# Altium footprint library myLibraryAltium.PcbLib: 215 footprints (part 4 of 14)
Each footprint in its own frame and in the unit in brackets; x right, y up, seen from the top. Pads: shape width x height; smd on the part's side, far side on the other; paste and mask are expansions set on the pad; w line width, h text height; cw(c..) or ccw(c..) is an arc to the next point about the centre after c.
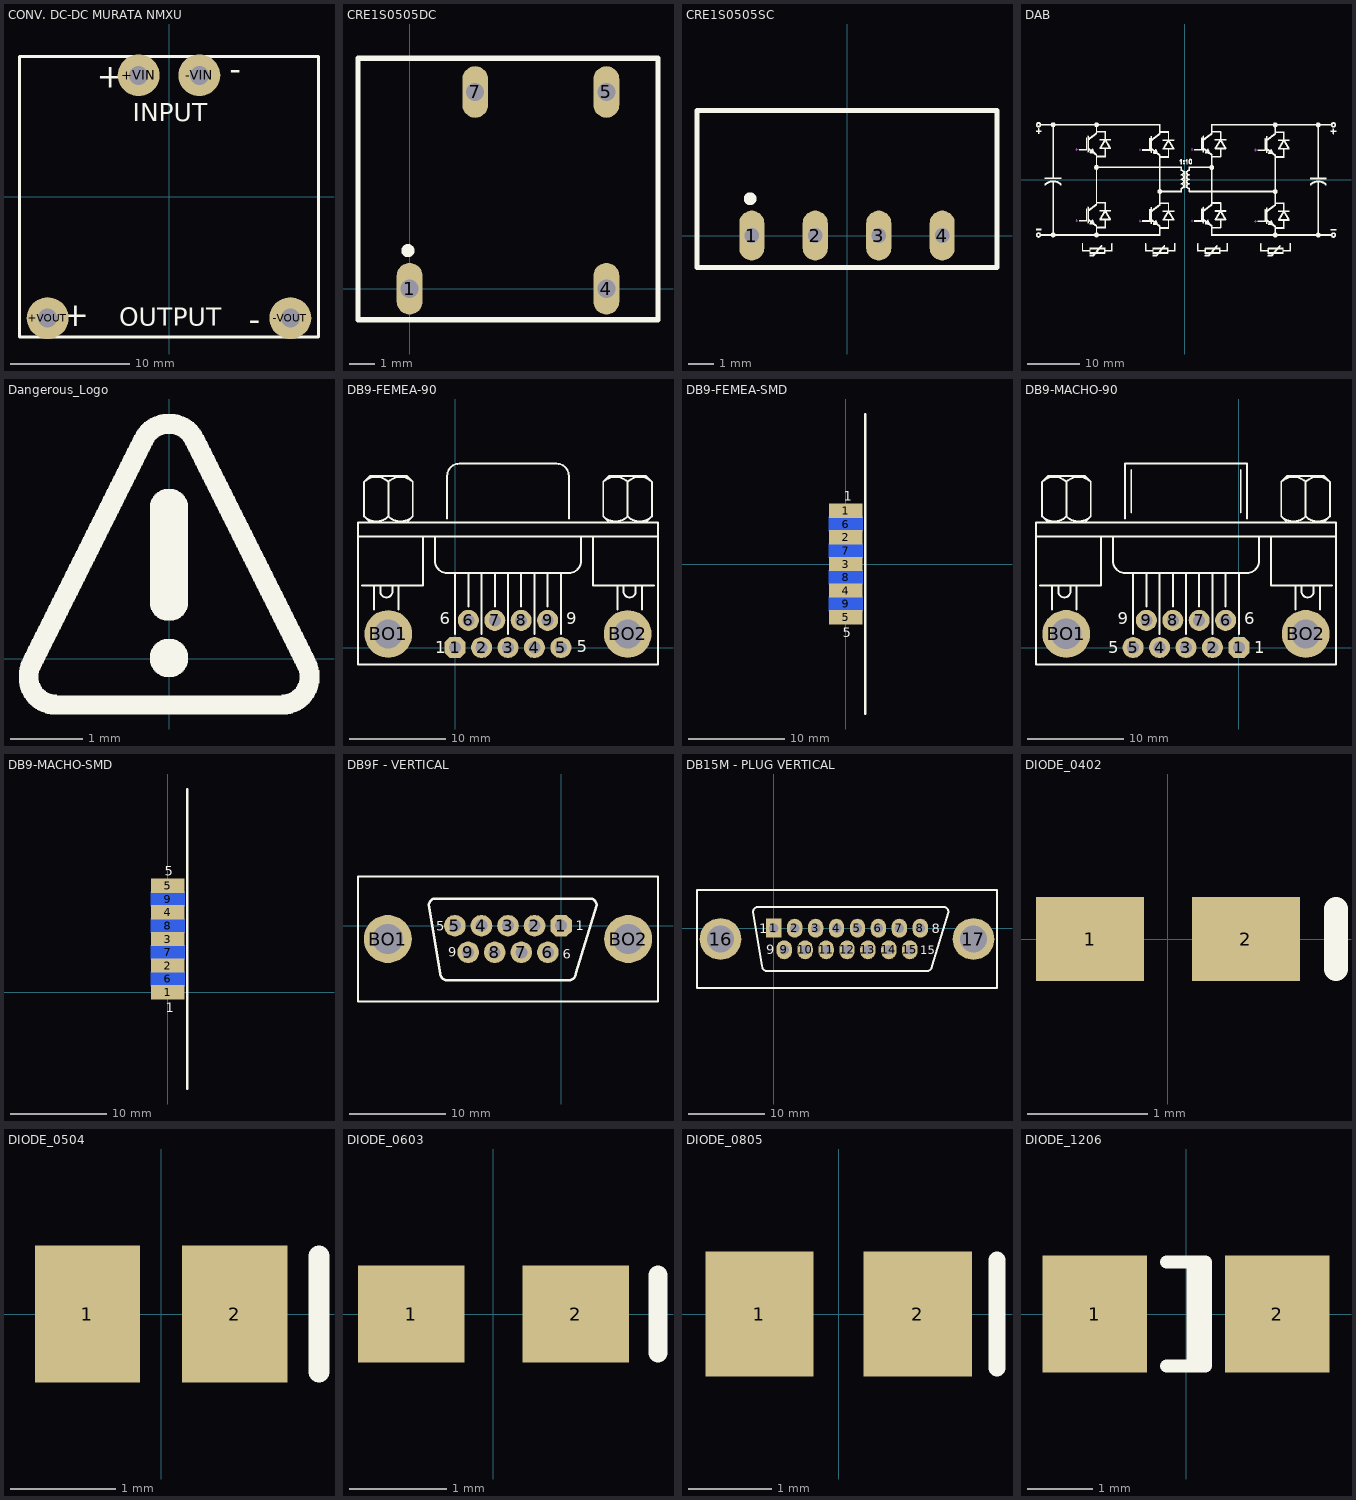
[diagram p3: the footprints below, top view; thin cyan lines are the x and y axes]

## CONV. DC-DC MURATA NMXU [mm]
pads (4):
  round 3.5 hole 1.6: +VIN(-2.54,10.16) +VOUT(-10.16,-10.16) -VIN(2.54,10.16) -VOUT(10.16,-10.16)
Top Overlay:
  lines w0.254: -12.515,-11.75 -12.515,11.75 12.515,11.75 12.515,-11.75 -12.515,-11.75
  text "+" at -6.655,-9.119 h2
  text "-" at 6.655,-11.201 h2
  text "-" at 6.045,11.201 h2
  text "+" at -6.045,9.119 h2
  text "OUTPUT" at -4.166,-10.82 h1.52
  text "INPUT" at -3.023,6.299 h1.52

## CRE1S0505DC [mm] "Murata 5V/5V"
pads (4):
  oval 1x2 hole 0.7: 1(0,0) 4(7.62,0) 5(7.62,7.62) 7(2.54,7.62)
Top Overlay:
  circle w0.254: c-0.065,1.475 r0.127
  lines w0.2: -2,-1.2 -2,8.925 9.62,8.925 9.62,-1.2 -2,-1.2
3D body: height 7, standoff 0, extent -2.1,-1.3 9.72,9.025

## CRE1S0505SC [mm] "Murata 5V/5V"
pads (4):
  oval 1x2 hole 0.6: 1(-3.81,0) 2(-1.27,0) 3(1.27,0) 4(3.81,0)
Top Overlay:
  circle w0.254: c-3.875,1.475 r0.127
  lines w0.2: -6,4.975 -6,-1.27 6,-1.27 6,4.975 ; -6,5 6,5
3D body: height 10, standoff 0, extent -6.1,-1.37 6.1,5.1

## DAB [mm] "94x57mm Sem sensores"
Top Overlay:
  drawing of 10125 lines, arcs and shapes, not listed
Mechanical 15:
  lines w0.127: -20.925,-7.823 -20.493,-7.823 ; -20.899,5.842 -20.467,5.842 ; -20.709,-8.039 -20.709,-7.607 ; -20.683,5.626 -20.683,6.058 ; -8.758,-7.899 -8.326,-7.899 ; -8.733,5.766 -8.301,5.766 ; -8.542,-8.115 -8.542,-7.683 ; -8.517,5.55 -8.517,5.982 ; 1.224,-7.849 1.656,-7.849 ; 1.224,5.817 1.656,5.817 ; 1.44,-8.064 1.44,-7.633 ; 1.44,5.601 1.44,6.032 ; 13.391,-7.925 13.823,-7.925 ; 13.391,5.74 13.823,5.74 ; 13.607,-8.141 13.607,-7.709 ; 13.607,5.524 13.607,5.956

## Dangerous_Logo [mm] "Micro Logotipo 15x15mm"
Top Overlay:
  drawing of 1247 lines, arcs and shapes, not listed

## DB9-FEMEA-90 [mm]
pads (11):
  oct 2.2x2.2 hole 1.25: 1(0,0)
  round 2.2 hole 1.25: 2(2.76,0) 3(5.52,0) 4(8.28,0) 5(11.04,0) 6(1.38,2.84) 7(4.14,2.84) 8(6.9,2.84) 9(9.66,2.84)
  round 4.978 hole 3.006: BO1(-6.98,1.42) BO2(18.02,1.42)
Top Overlay:
  lines w0.203: -10.143,11.578 21.183,11.578 ; -9.72,6.498 -3.37,6.498 -3.37,11.578 ; -9.511,13.693 ccw(c-8.238,14.965) -6.966,13.693 ; -9.511,17.295 cw(c-8.238,16.023) -6.966,17.295 ; -8.873,13.06 -9.508,13.695 -9.508,17.293 -8.873,17.928 -5.063,17.928 -4.428,17.293 -4.428,13.695 -5.063,13.06 ; -8.45,3.958 -8.45,6.498 ; -7.815,6.498 -7.815,5.863 ccw(c-7.18,5.863) -6.545,5.863 -6.545,6.498 ; -6.971,13.693 ccw(c-5.698,14.965) -4.426,13.693 ; -6.971,17.295 cw(c-5.698,16.023) -4.426,17.295 ; -6.968,13.695 -6.968,17.293 ; -5.91,3.958 -5.91,6.498 ; -2.1,11.578 -2.1,9.038 ccw(c-0.83,9.038) -0.83,7.768 11.87,7.768 ccw(c11.87,9.038) 13.14,9.038 13.14,11.578 ; -0.83,13.483 -0.83,17.928 cw(c0.44,17.928) 0.44,19.198 9.965,19.198 10.6,19.198 cw(c10.6,17.928) 11.87,17.928 11.87,13.483 ; 0,1.418 0,7.768 ; 1.38,4.296 1.38,7.765 ; 2.76,1.418 2.768,7.76 ; 4.14,4.296 4.14,7.765 ; 5.52,1.418 5.52,7.768 ; 6.9,4.296 6.9,7.765 ; 8.28,1.418 8.28,7.768 ; 9.66,4.296 9.66,7.765 ; 11.04,1.418 11.04,7.768 ; 14.41,11.578 14.41,6.498 20.76,6.498 ; 15.466,13.693 ccw(c16.738,14.965) 18.011,13.693 ; 15.466,17.295 cw(c16.738,16.023) 18.011,17.295 ; 16.103,13.06 15.468,13.695 15.468,17.293 16.103,17.928 19.913,17.928 20.548,17.293 20.548,13.695 19.913,13.06 ; 16.95,3.958 16.95,6.498 ; 17.585,6.498 17.585,5.863 ccw(c18.22,5.863) 18.855,5.863 18.855,6.498 ; 18.006,13.693 ccw(c19.278,14.965) 20.551,13.693 ; 18.006,17.295 cw(c19.278,16.023) 20.551,17.295 ; 18.008,13.695 18.008,17.293 ; 19.49,3.958 19.49,6.498 ; -10.143,-1.757 21.183,-1.757 21.183,13.06 -10.143,13.06 -10.143,-1.757
  text "9" at 11.616,2.434 h1.27
  text "5" at 12.674,-0.508 h1.27
  text "1" at -2.1,-0.614 h1.27
  text "6" at -1.592,2.434 h1.27

## DB9-FEMEA-SMD [mm]
pads (9):
  rect 3.5x1.5 smd: 1(0,5.52) 2(0,2.76) 3(0,0) 4(0,-2.76) 5(0,-5.52)
  rect 3.5x1.5 smd far side: 6(0,4.14) 7(0,1.38) 8(0,-1.38) 9(0,-4.14)
Top Overlay:
  lines w0.254: 2,-15.6 2,15.6
  text "1" at -0.2,6.58 h1
  text "5" at -0.3,-7.62 h1

## DB9-MACHO-90 [mm]
pads (11):
  oct 2.2x2.2 hole 1.25: 1(0,0)
  round 2.2 hole 1.25: 2(-2.76,0) 3(-5.52,0) 4(-8.28,0) 5(-11.04,0) 6(-1.38,2.84) 7(-4.14,2.84) 8(-6.9,2.84) 9(-9.66,2.84)
  round 5 hole 3.17: BO1(-18.02,1.42)
  round 5 hole 3.006: BO2(6.98,1.42)
Top Overlay:
  lines w0.203: -21.183,11.578 10.143,11.578 ; -20.76,6.498 -14.41,6.498 -14.41,11.578 ; -20.551,13.693 ccw(c-19.278,14.965) -18.006,13.693 ; -20.551,17.295 cw(c-19.278,16.023) -18.006,17.295 ; -19.913,13.06 -20.548,13.695 -20.548,17.293 -19.913,17.928 -16.103,17.928 -15.468,17.293 -15.468,13.695 -16.103,13.06 ; -19.49,3.958 -19.49,6.498 ; -18.855,6.498 -18.855,5.863 ccw(c-18.22,5.863) -17.585,5.863 -17.585,6.498 ; -18.011,13.693 ccw(c-16.738,14.965) -15.466,13.693 ; -18.011,17.295 cw(c-16.738,16.023) -15.466,17.295 ; -18.008,13.695 -18.008,17.293 ; -16.95,3.958 -16.95,6.498 ; -13.14,11.578 -13.14,9.038 ccw(c-11.87,9.038) -11.87,7.768 0.83,7.768 ccw(c0.83,9.038) 2.1,9.038 2.1,11.578 ; -11.87,13.483 -11.87,19.198 0.83,19.198 0.83,13.483 ; -11.235,14.118 -11.235,18.563 ; -11.04,1.418 -11.04,7.768 ; -9.66,4.3 -9.66,7.768 ; -8.28,1.418 -8.28,7.768 ; -6.9,4.3 -6.9,7.768 ; -5.52,1.418 -5.52,7.768 ; -4.14,4.3 -4.14,7.768 ; -2.76,1.418 -2.76,7.76 ; -1.38,4.3 -1.38,7.768 ; 0,1.418 0,7.768 ; 0.195,14.118 0.195,18.563 ; 3.37,11.578 3.37,6.498 9.72,6.498 ; 4.426,13.693 ccw(c5.698,14.965) 6.971,13.693 ; 4.426,17.295 cw(c5.698,16.023) 6.971,17.295 ; 5.063,13.06 4.428,13.695 4.428,17.293 5.063,17.928 8.873,17.928 9.508,17.293 9.508,13.695 8.873,13.06 ; 5.91,3.958 5.91,6.498 ; 6.545,6.498 6.545,5.863 ccw(c7.18,5.863) 7.815,5.863 7.815,6.498 ; 6.966,13.693 ccw(c8.238,14.965) 9.511,13.693 ; 6.966,17.295 cw(c8.238,16.023) 9.511,17.295 ; 6.968,13.695 6.968,17.293 ; 8.45,3.958 8.45,6.498 ; -21.183,-1.757 10.143,-1.757 10.143,13.06 -21.183,13.06 -21.183,-1.757
  text "6" at 0.576,2.434 h1.27
  text "1" at 1.592,-0.614 h1.27
  text "5" at -13.648,-0.614 h1.27
  text "9" at -12.632,2.434 h1.27

## DB9-MACHO-SMD [mm]
pads (9):
  rect 3.5x1.5 smd: 1(0,0) 2(0,2.76) 3(0,5.52) 4(0,8.28) 5(0,11.04)
  rect 3.5x1.5 smd far side: 6(0,1.38) 7(0,4.14) 8(0,6.9) 9(0,9.66)
Top Overlay:
  lines w0.254: 2,-10.08 2,21.12
  text "5" at -0.3,12.1 h1
  text "1" at -0.2,-2.1 h1

## DB9F - VERTICAL [mm]
pads (11):
  oct 2.25x2.25 hole 1.25: 1(0,0)
  round 2.25 hole 1.25: 2(-2.76,0) 3(-5.52,0) 4(-8.28,0) 5(-11.04,0) 6(-1.38,-2.76) 7(-4.14,-2.76) 8(-6.9,-2.76) 9(-9.66,-2.76)
  round 5 hole 3.17: BO1(-18.02,-1.38) BO2(6.98,-1.38)
Top Overlay:
  lines w0.203: -21.12,-7.88 -21.12,5.12 10.08,5.12 10.08,-7.88 -21.12,-7.88
  lines w0.254: -13.749,2.144 cw(c-13.069,2.14) -13.065,2.82 3.025,2.82 cw(c3.021,2.14) 3.701,2.136 1.524,-4.984 cw(c0.844,-4.98) 0.84,-5.66 -11.88,-5.66 cw(c-11.876,-4.98) -12.556,-4.976 -13.749,2.144
  text "9" at -11.735,-3.251 h1
  text "5" at -13.005,-0.533 h1
  text "1" at 1.524,-0.457 h1
  text "6" at 0.161,-3.454 h1

## DB15M - PLUG VERTICAL [mm]
pads (17):
  rect 2.032x2.5 hole 1.25: 1(0,0)
  oval 2.032x2.5 hole 1.25: 2(2.76,0) 3(5.52,0) 4(8.28,0) 5(11.04,0) 6(13.8,0) 7(16.56,0) 8(19.32,0) 9(1.38,-2.84) 10(4.14,-2.84) 11(6.9,-2.84) 12(9.66,-2.84) 13(12.42,-2.84) 14(15.18,-2.84) 15(17.94,-2.84)
  round 5.5 hole 3.5: 16(-7,-1.42) 17(26.32,-1.42)
Top Overlay:
  lines w0.254: -10.1,-7.885 29.42,-7.885 29.42,5.045 -10.1,5.045 -10.1,-7.885 ; -2.709,2.144 cw(c-2.029,2.14) -2.025,2.82 22.345,2.82 cw(c22.341,2.14) 23.021,2.136 20.844,-4.984 cw(c20.164,-4.98) 20.16,-5.66 -0.84,-5.66 cw(c-0.836,-4.98) -1.516,-4.976 -2.709,2.144
  text "8" at 20.836,-0.658 h1.27
  text "1" at -1.897,-0.658 h1.27
  text "9" at -1.008,-3.452 h1.27
  text "15" at 19.312,-3.452 h1.1

## DIODE_0402 [mm] "Chip Diode; Body 1.0 x 0.5 mm (LxW typ)"
height 0.6
pads (2):
  rect 0.9x0.7 smd: 1(-0.65,0) 2(0.65,0)
Top Overlay:
  lines w0.2: 1.4,-0.25 1.4,0.25

## DIODE_0504 [mm] "Chip Diode; Body 1.2 x 1.0 mm (LxW typ)"
height 1.02
pads (2):
  rect 1x1.3 smd: 1(-0.7,0) 2(0.7,0)
Top Overlay:
  lines w0.2: 1.5,-0.55 1.5,0.55

## DIODE_0603 [mm] "Chip Diode; Body 1.6 x 0.8 mm (LxW typ)"
height 0.85
pads (2):
  rect 1.1x1 smd: 1(-0.85,0) 2(0.85,0)
Top Overlay:
  lines w0.2: 1.7,-0.4 1.7,0.4

## DIODE_0805 [mm] "Chip Diode; Body 2.0 x 1.3 mm (LxW typ)"
height 1.1
pads (2):
  rect 1.3x1.5 smd: 1(-0.95,0) 2(0.95,0)
Top Overlay:
  lines w0.2: 1.9,-0.65 1.9,0.65

## DIODE_1206 [mm] "Chip Diode; Body 3.2 x 1.6 mm (LxW typ)"
height 1.35
pads (2):
  rect 1.6x1.8 smd: 1(-1.4,0) 2(1.4,0)
Top Overlay:
  lines w0.2: -0.3,-0.8 0.3,-0.8 0.3,0.8 -0.3,0.8 ; 0.11,-0.8 0.11,0.8